# Altium footprint library TomvanRijn-PCB.PcbLib: 165 footprints (part 3 of 11)
Each footprint in its own frame and in the unit in brackets; x right, y up, seen from the top. Pads: shape width x height; smd on the part's side, far side on the other; paste and mask are expansions set on the pad; w line width, h text height; cw(c..) or ccw(c..) is an arc to the next point about the centre after c.
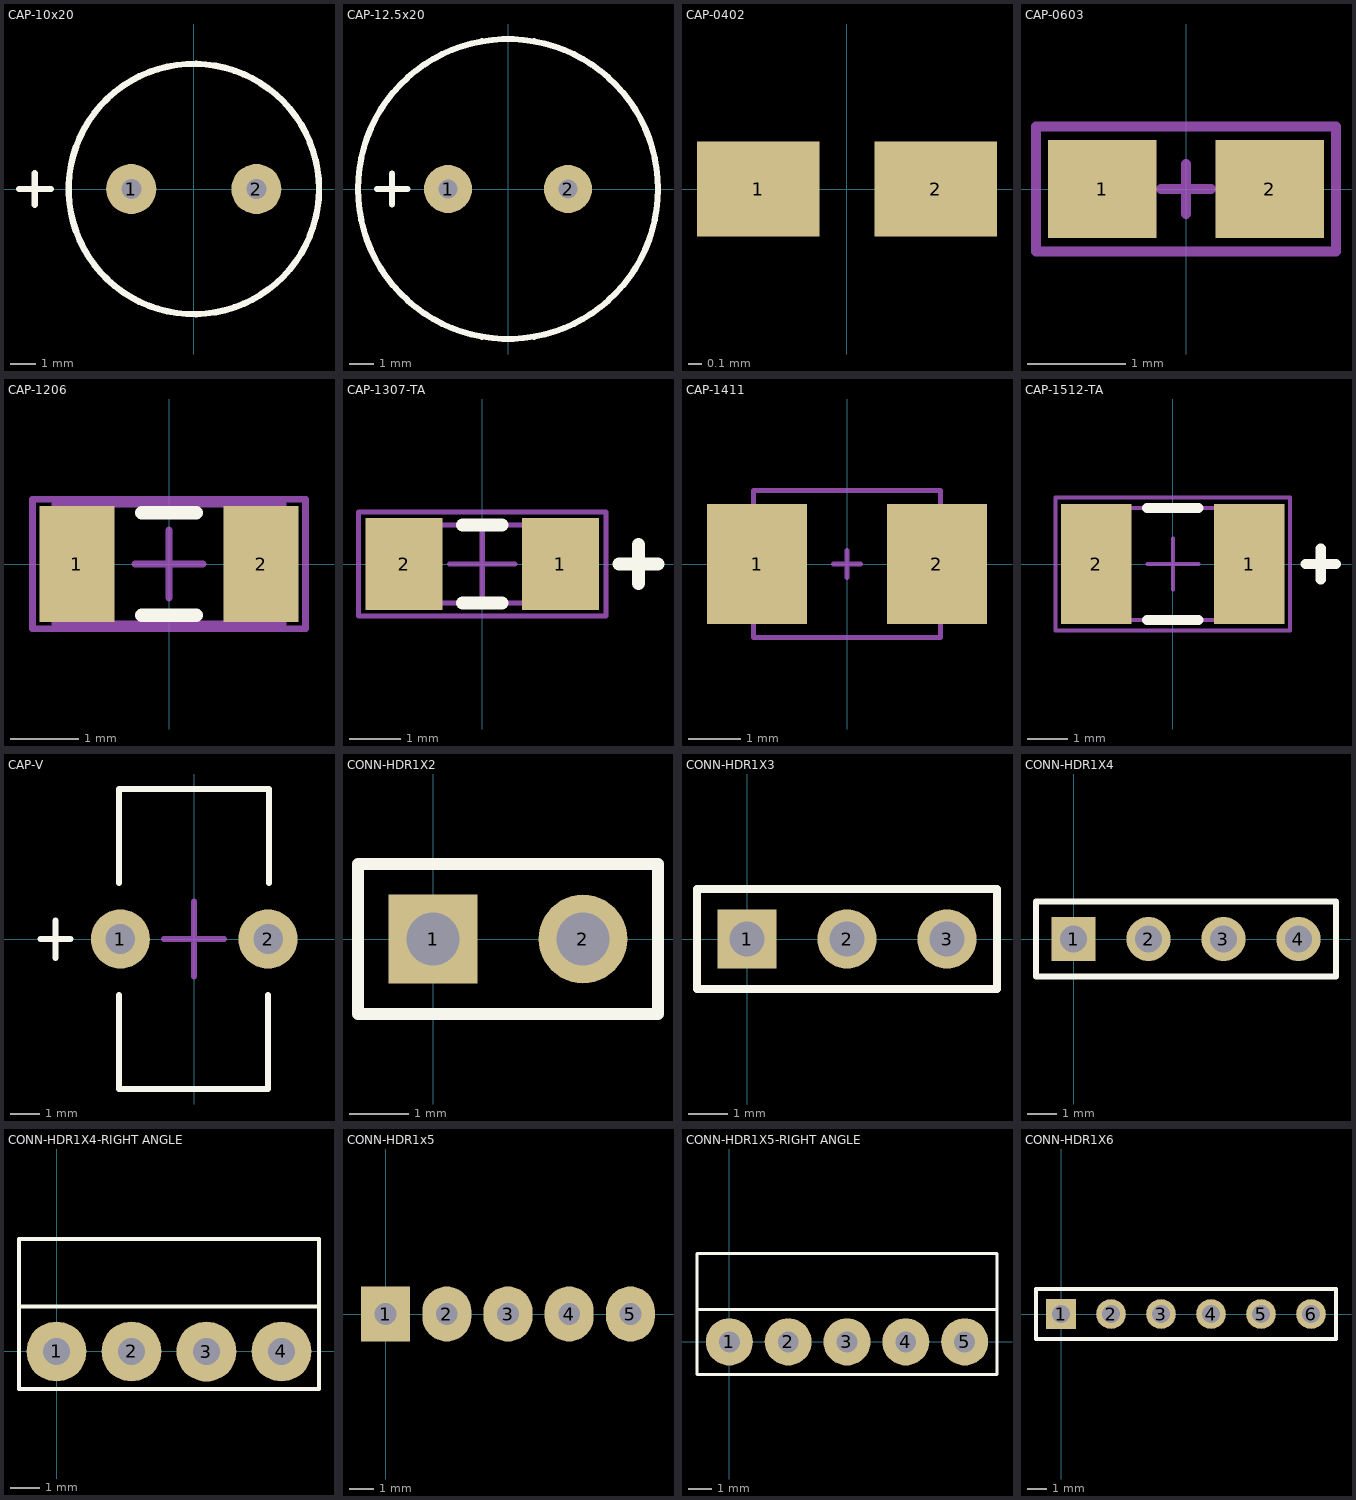
[diagram p2: the footprints below, top view; thin cyan lines are the x and y axes]

## CAP-10x20 [mm] "Capacitor, electrolytic, body 10 x 20 mm; 5 mm pitch"
height 20
pads (2):
  round 2 hole 0.8: 1(-2.5,0) 2(2.5,0)
Top Overlay:
  circle w0.254: c0,0 r5
  lines w0.254: -6.985,0 -5.715,0 ; -6.35,-0.635 -6.35,0.635
3D body "CAP-10X20.step": height 19.99, standoff -19, extent -5.047,-5 4.953,5

## CAP-12.5x20 [mm] "Capacitor, electrolytic, body 12.5 x 20 mm; 5 mm pitch"
height 20
pads (2):
  round 2 hole 0.8: 1(-2.5,0) 2(2.5,0)
Top Overlay:
  circle w0.254: c0,0 r6.25
  lines w0.254: -5.461,0 -4.191,0 ; -4.826,-0.635 -4.826,0.635
3D body "CAP-12.5x20.step": height 19.99, standoff -19, extent -6.25,-6.223 6.25,6.277

## CAP-0402 [mm] "Capacitor, SMD, 0402"
height 0.508
pads (2):
  rect 0.9x0.7 smd: 1(-0.65,0) 2(0.65,0)
3D body "0402-cap.step": height 0.55, standoff 0, extent -0.5,-0.25 0.5,0.25

## CAP-0603 [mm] "SMD capacitor, 0603"
height 1.397
pads (2):
  rect 1.1x1 smd: 1(-0.85,0) 2(0.85,0)
Mechanical 15:
  lines w0.1: -0.254,0 0.254,0 ; 0,-0.254 0,0.254 ; -1.524,-0.635 1.524,-0.635 1.524,0.635 -1.524,0.635 -1.524,-0.635
3D body "0603-cap.step": height 0.86, standoff 0, extent -0.8,-0.4 0.8,0.4

## CAP-1206 [mm] "SMD capacitor, 1206"
height 0.635
pads (2):
  rect 1.1x1.7 smd: 1(-1.35,0) 2(1.35,0)
Top Overlay:
  lines w0.2: -0.4,-0.75 0.4,-0.75 ; -0.4,0.75 0.4,0.75
Mechanical 13:
  lines w0.1: -1.675,-0.875 -1.675,0.875 1.675,0.875 1.675,-0.875 -1.675,-0.875
Mechanical 15:
  lines w0.1: -0.5,0 0.5,0 ; 0,-0.5 0,0.5 ; -2,-0.95 -2,0.95 2,0.95 2,-0.95 -2,-0.95
3D body "1206-cap.step": height 1, standoff 0, extent -1.6,-0.8 1.6,0.8

## CAP-1307-TA [mm] "SMD Capacitor, 1307, Tantalum"
height 2
pads (2):
  rect 1.5x1.8 smd: 1(1.524,0) 2(-1.524,0)
Top Overlay:
  lines w0.254: -0.381,-0.762 0.381,-0.762 ; -0.381,0.762 0.381,0.762 ; 2.667,0 3.429,0 ; 3.048,-0.381 3.048,0.381
Mechanical 13:
  lines w0.1: -1.651,-0.762 1.651,-0.762 1.651,0.762 -1.651,0.762 -1.651,-0.762
Mechanical 15:
  lines w0.1: -0.635,0 0.635,0 ; 0,-0.635 0,0.635 ; -2.413,-1.016 2.413,-1.016 2.413,1.016 -2.413,1.016 -2.413,-1.016
3D body "User Library-A Case SMT Capacitor.step": height 1.77, standoff 0.17, extent -1.587,-0.814 1.587,0.786

## CAP-1411 [mm] "Surface-Mount Tantalum Capacitor"
height 1.905
pads (2):
  rect 1.9x2.28 smd: 1(-1.71,0) 2(1.71,0)
Mechanical 15:
  lines w0.1: -0.254,0 0.254,0 ; 0,-0.254 0,0.254 ; -1.778,-1.397 1.778,-1.397 1.778,1.397 -1.778,1.397 -1.778,-1.397
3D body "User Library-cap_b.step": height 1.91, standoff 0, extent -1.746,-1.4 1.746,1.4

## CAP-1512-TA [mm] "SMD Capacitor, 1512, Tantalum"
height 2
pads (2):
  rect 1.75x3 smd: 1(1.905,0) 2(-1.905,0)
Top Overlay:
  lines w0.254: -0.635,-1.397 0.635,-1.397 ; -0.635,1.397 0.635,1.397 ; 3.302,0 4.064,0 ; 3.683,-0.381 3.683,0.381
Mechanical 13:
  lines w0.1: -1.778,-1.397 -1.778,1.397 1.778,1.397 1.778,-1.397 -1.778,-1.397
Mechanical 15:
  lines w0.1: -0.635,0 0.635,0 ; 0,-0.635 0,0.635 ; -2.921,-1.651 -2.921,1.651 2.921,1.651 2.921,-1.651 -2.921,-1.651
3D body "User Library-cap_b.step": height 1.91, standoff 0, extent -1.746,-1.4 1.746,1.4

## CAP-V [mm] "Capacitor, double layer, axial, 5 x 10.5 x 11.5 mm, 5 mm pitch"
height 11.5
pads (2):
  round 2 hole 1: 1(-2.5,0) 2(2.5,0)
Top Overlay:
  lines w0.203: -5.207,0 -4.699,0 ; -4.699,-0.635 -4.699,0 ; -4.699,0.635 -4.699,0 ; -4.191,0 -4.699,0 ; -2.54,-1.905 -2.54,-5.08 2.5,-5.08 2.5,-1.905 ; -2.54,1.905 -2.54,5.08 2.54,5.08 2.54,1.905
Mechanical 15:
  lines w0.203: -1.016,0 1.016,0 ; 0,-1.27 0,1.27
3D body: height 6, standoff -3, extent -2.897,-0.399 -2.1,0.399
3D body: height 6, standoff -3, extent 2.103,-0.399 2.9,0.399
3D body: height 11.21, standoff 0.75, extent -2.5,-5.24 2.5,5.24

## CONN-HDR1X2 [mm] "Connector; Header; 2 Position"
height 4.7
pads (2):
  rect 1.5x1.5 hole 0.9: 1(0,0)
  round 1.5 hole 0.9: 2(2.54,0)
Top Overlay:
  lines w0.2: -1.27,-1.27 3.81,-1.27 3.81,1.27 -1.27,1.27 -1.27,-1.27
3D body "HDR2.step": height 8.45, standoff -2.53, extent -1.27,-1.27 3.81,1.27

## CONN-HDR1X3 [mm] "Connector; Header; 3 Position"
height 6.35
pads (3):
  rect 1.5x1.5 hole 0.9: 1(0,0)
  round 1.5 hole 0.9: 2(2.54,0) 3(5.08,0)
Top Overlay:
  lines w0.2: -1.27,-1.27 -1.27,1.27 6.35,1.27 6.35,-1.27 -1.27,-1.27
3D body "User Library-PinHeaderX3.STEP": height 8.53, standoff -3.68, extent -1.27,-1.46 6.35,1.46

## CONN-HDR1X4 [mm] "Connector; Header; 4 Position"
pads (4):
  rect 1.5x1.5 hole 0.9: 1(0,0)
  round 1.5 hole 0.9: 2(2.54,0) 3(5.08,0) 4(7.62,0)
Top Overlay:
  lines w0.2: -1.27,-1.27 -1.27,1.27 8.89,1.27 8.89,-1.27 -1.27,-1.27
3D body "HDR4.step": height 11.7, standoff -3.54, extent -1.27,-2.972 8.89,2.87

## CONN-HDR1X4-RIGHT ANGLE [mil] "1X4 Male 90 degree Header"
pads (4):
  round 80 hole 35.43: 1(0,0) 2(100,0) 3(199.99,-0.01) 4(300,0)
Top Overlay:
  lines w5: -50,60 350,60 ; -50,-50 350,-50 350,150 -50,150 -50,-50
3D body "User Library-Header_Male_RA_Low_4Pin.STEP": height 99.02, standoff -118.11, extent -50,-12.6 350,386.22

## CONN-HDR1x5 [mil] "Male 1x5 Header 2.54mm pitch"
pads (5):
  rect 80x90 hole 35.43: 1(0,0)
  oval 80x90 hole 35.43: 2(100,0) 3(200,0) 4(300,0) 5(400,0)
3D body "User Library-Header_Male_5Pin.STEP": height 336.22, standoff -118.11, extent -49.99,-49.01 450.01,49.02

## CONN-HDR1X5-RIGHT ANGLE [mil] "1X5 Male Right Angle 2.54mm Header"
pads (5):
  round 80 hole 35.43: 1(0,0) 2(100,0) 3(200,0) 4(300,0) 5(400,0)
Top Overlay:
  lines w5: -55,55 455,55 ; -55,-55 455,-55 455,150 -55,150 -55,-55
3D body "User Library-Header_Male_RA_Low_5Pin.STEP": height 99.02, standoff -118.11, extent -49.99,-12.59 450.01,386.23

## CONN-HDR1X6 [mm] "Connector; Header; 6 Position"
height 6.35
pads (6):
  rect 1.5x1.5 hole 0.9: 1(0,0)
  round 1.5 hole 0.9: 2(2.54,0) 3(5.08,0) 4(7.62,0) 5(10.16,0) 6(12.7,0)
Top Overlay:
  lines w0.2: -1.27,-1.27 13.97,-1.27 13.97,1.27 -1.27,1.27 -1.27,-1.27
3D body "User Library-molex kk 0_1in latching 6 way vertical header.step": height 11.8, standoff -3.44, extent -1.27,-2.972 13.97,2.87